# Altium footprint library PcbLib_Discrete.PcbLib: 118 footprints (part 4 of 8)
Each footprint in its own frame and in the unit in brackets; x right, y up, seen from the top. Pads: shape width x height; smd on the part's side, far side on the other; paste and mask are expansions set on the pad; w line width, h text height; cw(c..) or ccw(c..) is an arc to the next point about the centre after c.
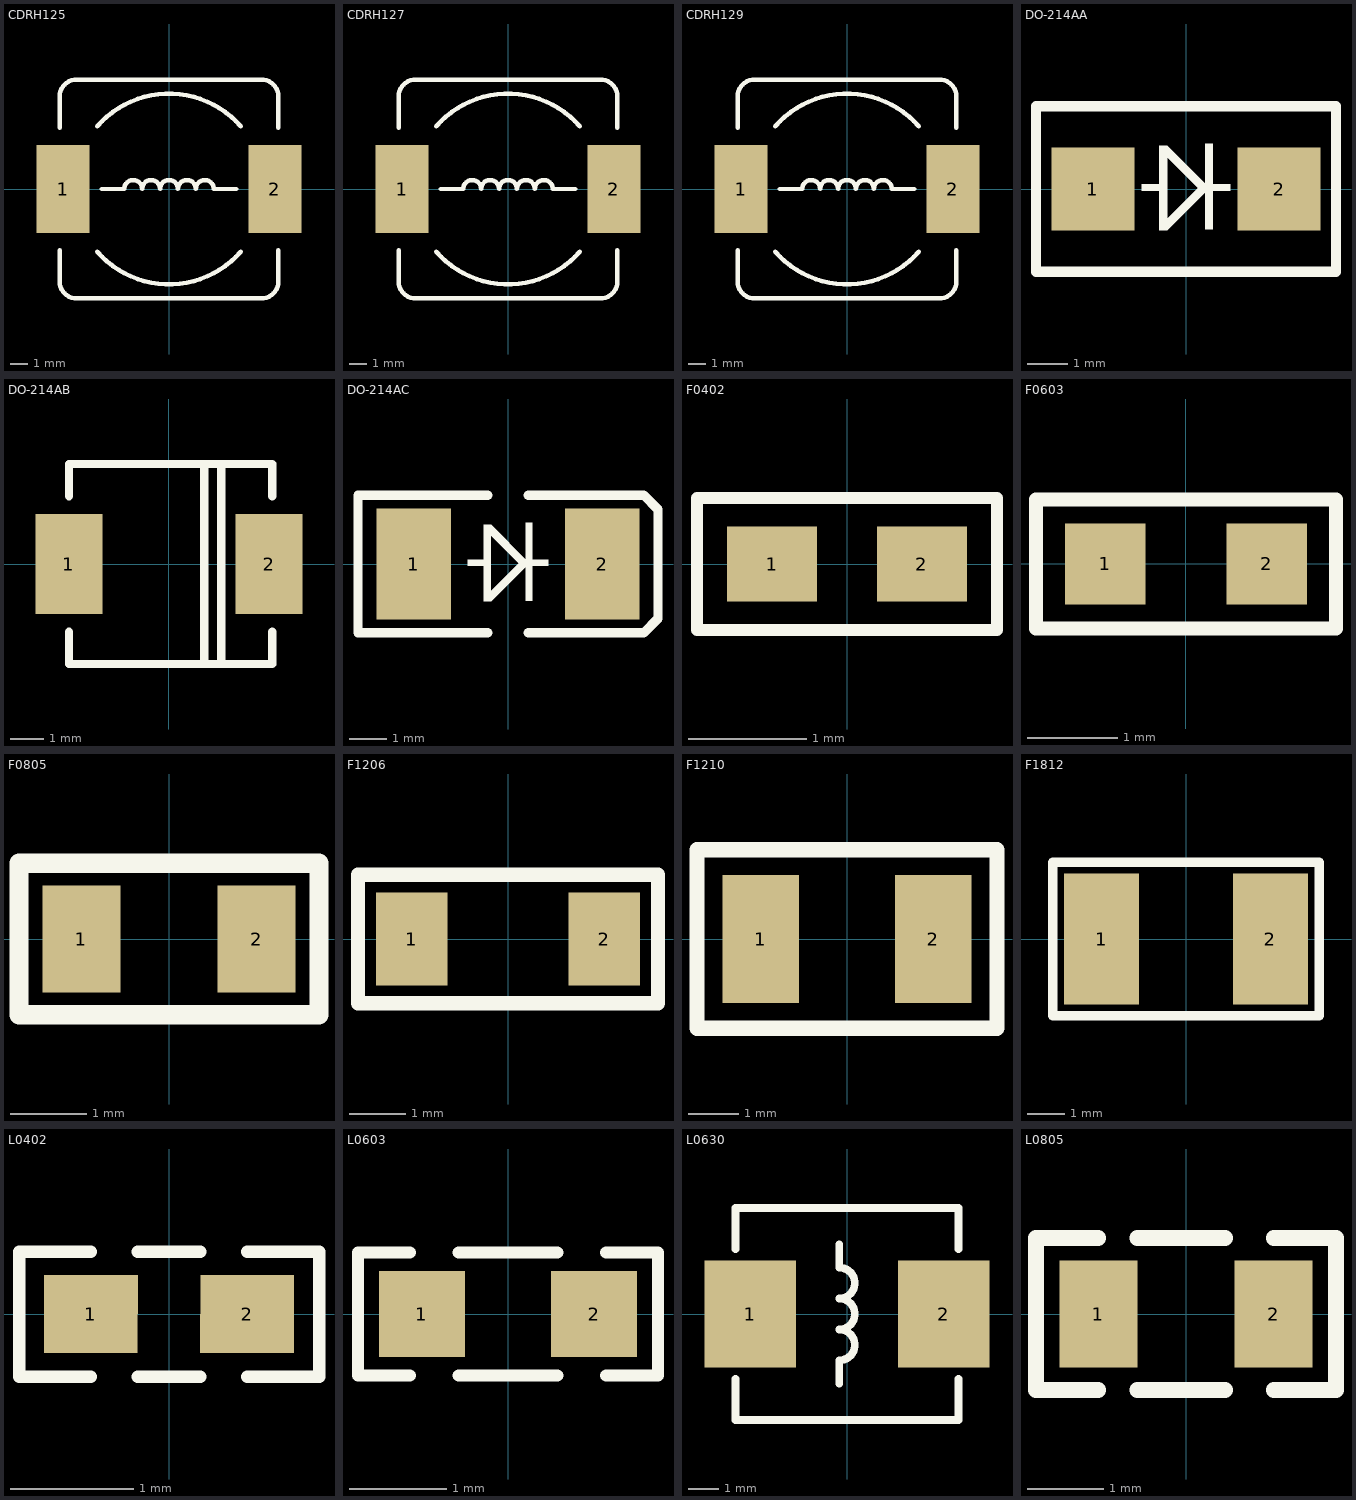
[diagram p3: the footprints below, top view; thin cyan lines are the x and y axes]

## CDRH125 [mm] "12*12*5mm（长宽高）"
pads (2):
  rect 3x5 smd: 1(-6,0) 2(6,0)
Top Overlay:
  lines w0.254: -6.2,-3.475 -6.2,-5.23 ccw(c-5.23,-5.23) -5.23,-6.2 5.23,-6.2 ccw(c5.23,-5.23) 6.2,-5.23 6.2,-3.475 ; -6.2,3.475 -6.2,5.23 cw(c-5.23,5.23) -5.23,6.2 5.23,6.2 cw(c5.23,5.23) 6.2,5.23 6.2,3.475 ; -4.064,-3.556 ccw(c0,0) 4.064,-3.556 ; -4.064,3.556 cw(c0,0) 4.064,3.556 ; -3.81,0 -2.54,0 cw(c-2.032,0) -1.524,0 cw(c-1.016,0) -0.508,0 cw(c0,0) 0.508,0 cw(c1.016,0) 1.524,0 cw(c2.032,0) 2.54,0 3.81,0
3D body "CDRH125.STEP": height 5.05, standoff 0.05, extent -6,-6 6,6

## CDRH127 [mm] "12*12*8mm（长宽高）"
pads (2):
  rect 3x5 smd: 1(-6,0) 2(6,0)
Top Overlay:
  lines w0.254: -6.2,-3.475 -6.2,-5.23 ccw(c-5.23,-5.23) -5.23,-6.2 5.23,-6.2 ccw(c5.23,-5.23) 6.2,-5.23 6.2,-3.475 ; -6.2,3.475 -6.2,5.23 cw(c-5.23,5.23) -5.23,6.2 5.23,6.2 cw(c5.23,5.23) 6.2,5.23 6.2,3.475 ; -4.064,-3.556 ccw(c0,0) 4.064,-3.556 ; -4.064,3.556 cw(c0,0) 4.064,3.556 ; -3.81,0 -2.54,0 cw(c-2.032,0) -1.524,0 cw(c-1.016,0) -0.508,0 cw(c0,0) 0.508,0 cw(c1.016,0) 1.524,0 cw(c2.032,0) 2.54,0 3.81,0
3D body "CDRH127.STEP": height 7.8, standoff 0, extent -6,-6 6,6

## CDRH129 [mm] "12*12*9.5mm（长宽高）"
pads (2):
  rect 3x5 smd: 1(-6,0) 2(6,0)
Top Overlay:
  lines w0.254: -6.2,-3.475 -6.2,-5.23 ccw(c-5.23,-5.23) -5.23,-6.2 5.23,-6.2 ccw(c5.23,-5.23) 6.2,-5.23 6.2,-3.475 ; -6.2,3.475 -6.2,5.23 cw(c-5.23,5.23) -5.23,6.2 5.23,6.2 cw(c5.23,5.23) 6.2,5.23 6.2,3.475 ; -4.064,-3.556 ccw(c0,0) 4.064,-3.556 ; -4.064,3.556 cw(c0,0) 4.064,3.556 ; -3.81,0 -2.54,0 cw(c-2.032,0) -1.524,0 cw(c-1.016,0) -0.508,0 cw(c0,0) 0.508,0 cw(c1.016,0) 1.524,0 cw(c2.032,0) 2.54,0 3.81,0
3D body "CDRH129.STEP": height 9.65, standoff 0.05, extent -6,-6 6,6

## DO-214AA [mil] "SMB"
pads (2):
  rect 80x80 smd: 1(-90,0) 2(90,0)
Top Overlay:
  region: 43,-2 43,5 24,5 24,-2
  region: 15.57,-3.58 21.58,2.42 -18,42 -24.01,35.99
  region: -25,-2 -25,5 -43,5 -43,-2
  rectangle: 18.5,-39 26,44
  rectangle: -26,-40 -18,42
  region: 21.61,-0.46 15.61,5.55 -23.97,-34.03 -17.96,-40.04
  lines w10: -145,-80 -145,80 145,80 145,-80 -145,-80
3D body "DO-214AA.STEP": height 98.43, standoff 0, extent -110.24,-78.54 110.24,75

## DO-214AB [mm] "SMC"
pads (2):
  rect 2x3 smd: 1(-3,0) 2(3,0)
Top Overlay:
  lines w0.254: -3,-2.032 -3,-3 3.096,-3 3.096,-2.032 ; -3,2.032 -3,3 3.096,3 3.096,2.032 ; 1.064,-3 1.064,3 ; 1.572,-3 1.572,3
3D body "DO-214AB.STEP": height 2.7, standoff 0, extent -4.012,-3.1 4.108,3.1

## DO-214AC [mm] "SMA"
pads (2):
  rect 2x3 smd: 1(-2.54,0) 2(2.54,0)
Top Overlay:
  region: 1.092,-0.051 1.092,0.127 0.61,0.127 0.61,-0.051
  region: 0.395,-0.091 0.548,0.062 -0.457,1.067 -0.61,0.914
  region: -0.635,-0.051 -0.635,0.127 -1.092,0.127 -1.092,-0.051
  rectangle: 0.47,-0.991 0.66,1.118
  rectangle: -0.66,-1.016 -0.457,1.067
  region: 0.549,-0.012 0.396,0.141 -0.609,-0.864 -0.456,-1.017
  lines w0.254: -0.54,-1.852 -4.04,-1.852 -4.04,1.852 -0.54,1.852 ; 0.54,-1.852 3.66,-1.852 4.04,-1.472 4.04,1.472 3.66,1.852 0.54,1.852
3D body "DO-214AC.STEP": height 2.4, standoff 0, extent -2.3,-1.35 2.3,1.35

## F0402 [mil]
pads (2):
  rect 30x25 smd: 1(-25,0) 2(25,0)
Top Overlay:
  lines w4: -50,-22 50,-22 50,22 -50,22 -50,-22
3D body "12.STEP": height 14.57, standoff 0, extent -19.68,-10 19.68,10.47

## F0603 [mil]
pads (2):
  rect 35x35 smd: 1(-35,0) 2(35,0)
Top Overlay:
  lines w6: -65,-28 65,-28 65,28 -65,28 -65,-28
3D body "11.STEP": height 20.47, standoff 0, extent -31.5,-16.14 31.5,16.14

## F0805 [mil]
pads (2):
  rect 40x55 smd: 1(-45,0) 2(45,0)
Top Overlay:
  lines w10: -77,-39 77,-39 77,39 -77,39 -77,-39
3D body "10.STEP": height 20.47, standoff 0, extent -40,-24.02 38.74,24.02

## F1206 [mil]
pads (2):
  rect 50x65 smd: 1(-67.5,0) 2(67.5,0)
Top Overlay:
  lines w10: -105,-45 -105,45 105,45 105,-45 -105,-45
3D body "9.STEP": height 34.25, standoff 0, extent -62.99,-31.89 62.99,31.89

## F1210 [mil]
pads (2):
  rect 60x100 smd: 1(-67.5,0) 2(67.5,0)
Top Overlay:
  lines w12: -117.5,-70 -117.5,70 117.5,70 117.5,-70 -117.5,-70
3D body "Fuse1210.STEP": height 26.57, standoff 0, extent -63.29,-50.69 63.29,50.69

## F1812 [mm]
pads (2):
  rect 2x3.5 smd: 1(-2.25,0) 2(2.25,0)
Top Overlay:
  lines w0.254: -3.551,-2.051 3.551,-2.051 3.551,2 ; -3.5,-2.051 -3.551,-2 -3.551,2.051 3.551,2.051
3D body "User Library-fuse1812.STEP": height 1.32, standoff 0, extent -2.41,-1.61 2.41,1.61

## L0402 [mil]
pads (2):
  rect 30x25 smd: 1(-25,0) 2(25,0)
Top Overlay:
  lines w4: -25,-20 -48,-20 -48,20 -25,20 ; -10,-20 10,-20 ; -10,20 10,20 ; 25,-20 48,-20 48,20 25,20
3D body "0402L.STEP": height 19.68, standoff 0, extent -19.69,-9.68 19.69,10

## L0603 [mil]
pads (2):
  rect 35x35 smd: 1(-35,0) 2(35,0)
Top Overlay:
  lines w5: -40,-25 -61,-25 -61,25 -40,25 ; -20,-25 20,-25 ; -20,25 20,25 ; 40,-25 61,-25 61,25 40,25
3D body "0603L.STEP": height 31.5, standoff 0, extent -31.5,-16.5 31.5,15

## L0630 [mm]
pads (2):
  rect 3x3.5 smd: 1(-3.175,0) 2(3.175,0)
Top Overlay:
  lines w0.254: -3.658,-2.134 -3.658,-3.48 3.658,-3.48 3.658,-2.134 ; -3.658,2.134 -3.658,3.48 3.658,3.48 3.658,2.134 ; -0.254,-2.286 -0.254,-1.524 ccw(c-0.254,-1.016) -0.254,-0.508 ccw(c-0.254,0) -0.254,0.508 ccw(c-0.254,1.016) -0.254,1.524 -0.254,2.286
3D body "SMD0630L.STEP": height 3.05, standoff 0.02, extent -3.475,-3.3 3.475,3.3

## L0805 [mil]
pads (2):
  rect 40x55 smd: 1(-45,0) 2(45,0)
Top Overlay:
  lines w8: -45,-39 -77,-39 -77,39 -45,39 ; -25,-39 20,-39 ; -25,39 20,39 ; 45,-39 77,-39 77,39 45,39
3D body "0805L.STEP": height 35.43, standoff 0, extent -35,-23.62 43.74,23.62